# Altium footprint library SoM_Artix.PcbLib: 239 footprints (part 4 of 15)
Each footprint in its own frame and in the unit in brackets; x right, y up, seen from the top. Pads: shape width x height; smd on the part's side, far side on the other; paste and mask are expansions set on the pad; w line width, h text height; cw(c..) or ccw(c..) is an arc to the next point about the centre after c.
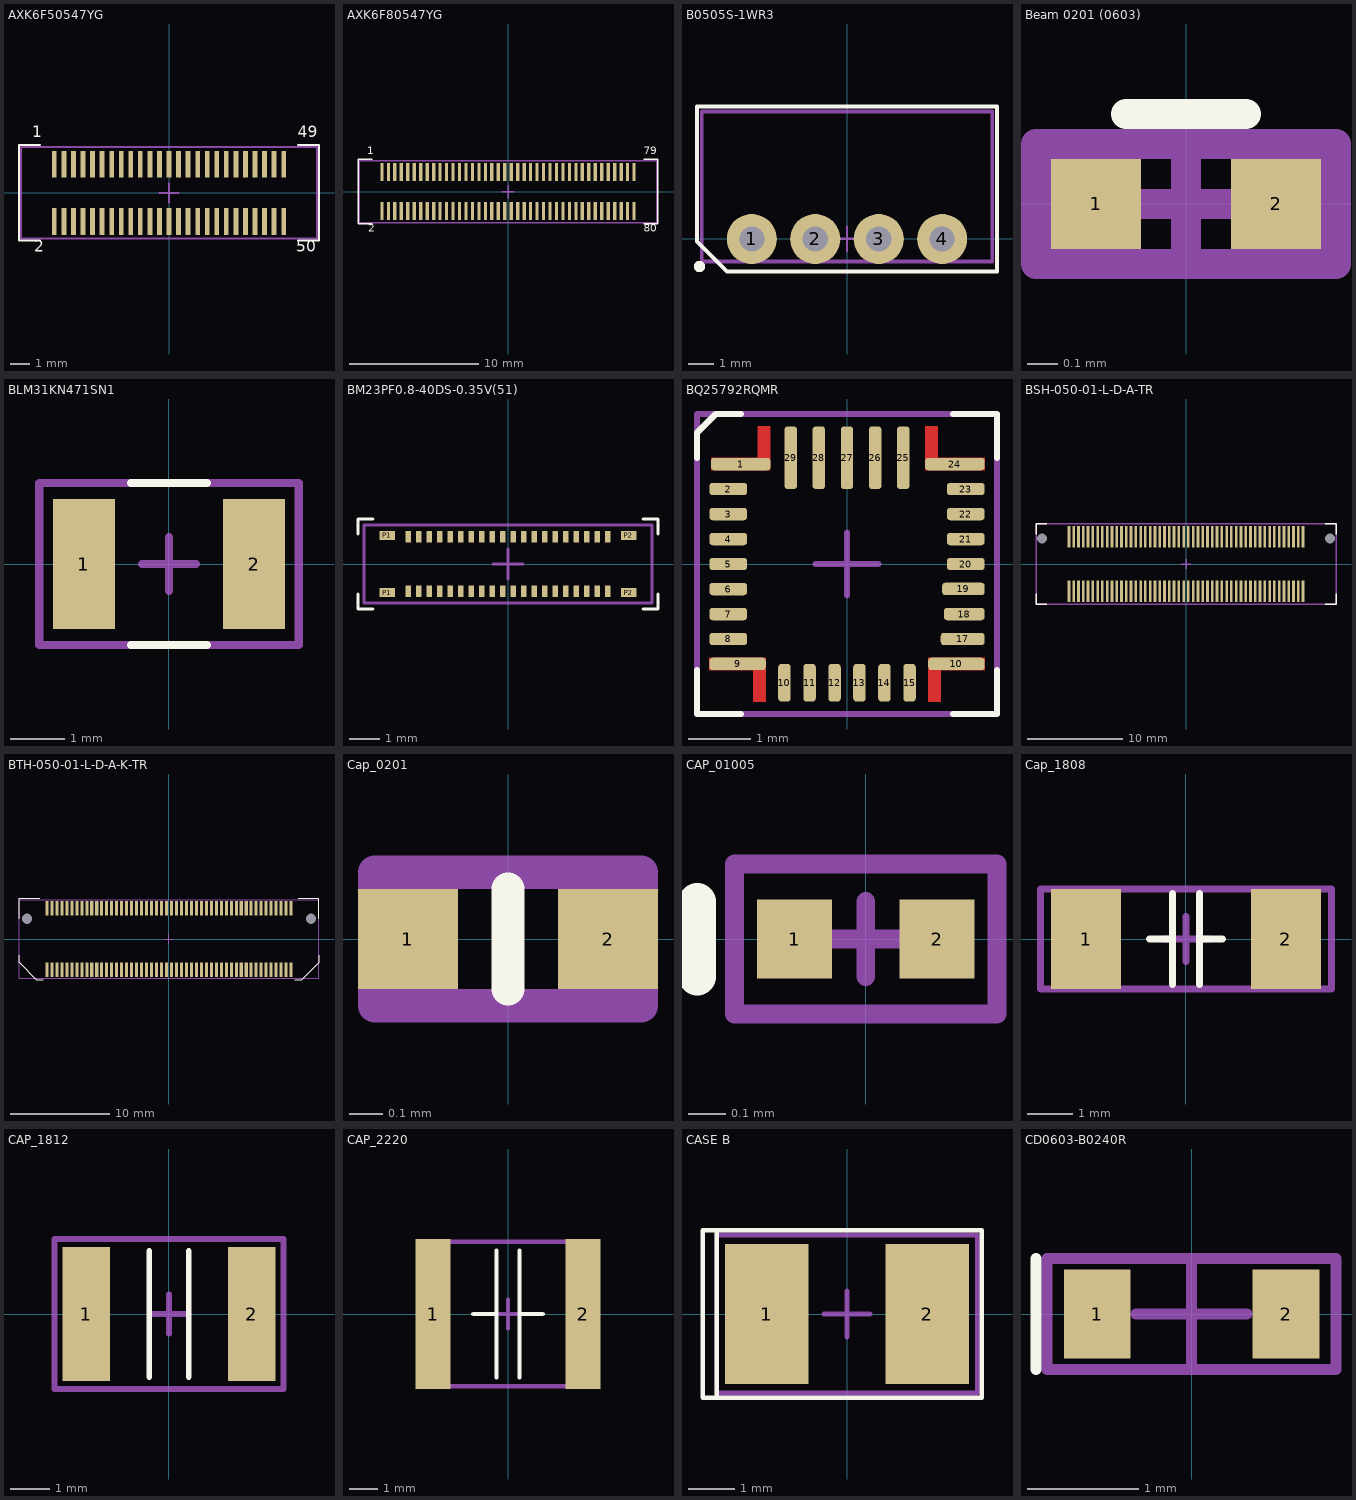
[diagram p3: the footprints below, top view; thin cyan lines are the x and y axes]

## AXK6F50547YG [mm] "Socket (Mated height: 2.5 mm)"
height 2.5
pads (50):
  rect 0.25x1.4 smd: 1(-6,1.5) 2(-6,-1.5) 3(-5.5,1.5) 4(-5.5,-1.5) 5(-5,1.5) 6(-5,-1.5) 7(-4.5,1.5) 8(-4.5,-1.5) 9(-4,1.5) 10(-4,-1.5) 11(-3.5,1.5) 12(-3.5,-1.5) 13(-3,1.5) 14(-3,-1.5) 15(-2.5,1.5) 16(-2.5,-1.5) 17(-2,1.5) 18(-2,-1.5) 19(-1.5,1.5) 20(-1.5,-1.5) 21(-1,1.5) 22(-1,-1.5) 23(-0.5,1.5) 24(-0.5,-1.5) 25(0,1.5) 26(0,-1.5) 27(0.5,1.5) 28(0.5,-1.5) 29(1,1.5) 30(1,-1.5) 31(1.5,1.5) 32(1.5,-1.5) 33(2,1.5) 34(2,-1.5) 35(2.5,1.5) 36(2.5,-1.5) 37(3,1.5) 38(3,-1.5) 39(3.5,1.5) 40(3.5,-1.5) 41(4,1.5) 42(4,-1.5) 43(4.5,1.5) 44(4.5,-1.5) 45(5,1.5) 46(5,-1.5) 47(5.5,1.5) 48(5.5,-1.5) 49(6,1.5) 50(6,-1.5)
Top Overlay:
  lines w0.1: -6.75,-2.5 -7.85,-2.5 -7.85,2.5 -6.75,2.5 ; 6.75,-2.5 7.85,-2.5 7.85,2.5 6.75,2.5
  text "50" at 6.65,-3.3 h1
  text "49" at 6.75,2.7 h1
  text "2" at -7.05,-3.3 h1
  text "1" at -7.15,2.7 h1
Mechanical 15:
  lines w0.1: -0.5,0 0.5,0 ; 0,-0.5 0,0.5 ; -7.75,-2.4 -7.75,2.4 7.75,2.4 7.75,-2.4 -7.75,-2.4
3D body "axk6f50547y.stp": height 1.75, standoff 0, extent -7.75,-1.65 7.75,1.65

## AXK6F80547YG [mm] "Socket (Mated height: 23 mm, 3.3 mm, 2.5 mm)"
height 2.5
pads (80):
  rect 0.25x1.4 smd: 1(-9.75,1.5) 2(-9.75,-1.5) 3(-9.25,1.5) 4(-9.25,-1.5) 5(-8.75,1.5) 6(-8.75,-1.5) 7(-8.25,1.5) 8(-8.25,-1.5) 9(-7.75,1.5) 10(-7.75,-1.5) 11(-7.25,1.5) 12(-7.25,-1.5) 13(-6.75,1.5) 14(-6.75,-1.5) 15(-6.25,1.5) 16(-6.25,-1.5) 17(-5.75,1.5) 18(-5.75,-1.5) 19(-5.25,1.5) 20(-5.25,-1.5) 21(-4.75,1.5) 22(-4.75,-1.5) 23(-4.25,1.5) 24(-4.25,-1.5) 25(-3.75,1.5) 26(-3.75,-1.5) 27(-3.25,1.5) 28(-3.25,-1.5) 29(-2.75,1.5) 30(-2.75,-1.5) 31(-2.25,1.5) 32(-2.25,-1.5) 33(-1.75,1.5) 34(-1.75,-1.5) 35(-1.25,1.5) 36(-1.25,-1.5) 37(-0.75,1.5) 38(-0.75,-1.5) 39(-0.25,1.5) 40(-0.25,-1.5) 41(0.25,1.5) 42(0.25,-1.5) 43(0.75,1.5) 44(0.75,-1.5) 45(1.25,1.5) 46(1.25,-1.5) 47(1.75,1.5) 48(1.75,-1.5) 49(2.25,1.5) 50(2.25,-1.5) 51(2.75,1.5) 52(2.75,-1.5) 53(3.25,1.5) 54(3.25,-1.5) 55(3.75,1.5) 56(3.75,-1.5) 57(4.25,1.5) 58(4.25,-1.5) 59(4.75,1.5) 60(4.75,-1.5) 61(5.25,1.5) 62(5.25,-1.5) 63(5.75,1.5) 64(5.75,-1.5) 65(6.25,1.5) 66(6.25,-1.5) 67(6.75,1.5) 68(6.75,-1.5) 69(7.25,1.5) 70(7.25,-1.5) 71(7.75,1.5) 72(7.75,-1.5) 73(8.25,1.5) 74(8.25,-1.5) 75(8.75,1.5) 76(8.75,-1.5) 77(9.25,1.5) 78(9.25,-1.5) 79(9.75,1.5) 80(9.75,-1.5)
Top Overlay:
  lines w0.1: -10.5,-2.5 -11.6,-2.5 -11.6,2.5 -10.5,2.5 ; 10.5,-2.5 11.6,-2.5 11.6,2.5 10.5,2.5
  text "2" at -10.8,-3.3 h1
  text "1" at -10.9,2.7 h1
  text "79" at 10.5,2.7 h1
  text "80" at 10.5,-3.3 h1
Mechanical 15:
  lines w0.1: -0.5,0 0.5,0 ; 0,-0.5 0,0.5 ; -11.5,-2.4 -11.5,2.4 11.5,2.4 11.5,-2.4 -11.5,-2.4
3D body "axk6f80547y.stp": height 1.75, standoff 0, extent -11.5,-1.65 11.5,1.65

## B0505S-1WR3 [mm]
pads (4):
  round 2 hole 1 mask+0.08: 1(-3.81,0) 2(-1.27,0) 3(1.27,0) 4(3.81,0)
Top Overlay:
  circle w0.254: c-5.9,-1.1 r0.1
  lines w0.15: -6,-0.1 -4.8,-1.3 6,-1.3 6,5.3 -6,5.3 -6,-0.1
Mechanical 15:
  lines w0.1: -0.5,0 0.5,0 ; 0,-0.5 0,0.5
  lines w0.15: -5.81,-0.9 5.81,-0.9 5.81,5.1 -5.81,5.1 -5.81,-0.9
3D body "B_S-1WR3.stp": height 10.2, standoff -4.06, extent -5.8,-0.85 5.8,5.15

## Beam 0201 (0603) [mm] "Ferrite Beam"
pads (2):
  rect 0.3x0.3 smd mask+0.05: 1(-0.3,0) 2(0.3,0)
Top Overlay:
  lines w0.1: -0.2,0.3 0.2,0.3
Mechanical 15:
  lines w0.1: -0.2,0 0.2,0 ; 0,-0.2 0,0.2 ; 0,0.2 -0.5,0.2 -0.5,-0.2 0.5,-0.2 0.5,0.2 0,0.2
3D body "742692003.stp": height 0.29, standoff -0.01, extent -0.3,-0.15 0.3,0.15

## BLM31KN471SN1 [mm]
pads (2):
  rect 1.15x2.4 smd: 1(-1.575,0) 2(1.575,0)
Top Overlay:
  lines w0.15: -0.7,-1.5 0.7,-1.5 ; -0.7,1.5 0.7,1.5
Mechanical 15:
  lines w0.15: -0.5,0 0.5,0 ; 0,-0.5 0,0.5 ; -2.4,-1.5 -2.4,1.5 2.4,1.5 2.4,-1.5 -2.4,-1.5
3D body "User Library-BLM31PG330SN1.step": height 1.11, standoff -0.01, extent -1.6,-0.81 1.6,0.81

## BM23PF0.8-40DS-0.35V(51) [mm]
height 0.8
pads (44):
  rect 0.18x0.38 smd mask+0.1: 1(-3.325,0.91) 2(-3.325,-0.91) 3(-2.975,0.91) 4(-2.975,-0.91) 5(-2.625,0.91) 6(-2.625,-0.91) 7(-2.275,0.91) 8(-2.275,-0.91) 9(-1.925,0.91) 10(-1.925,-0.91) 11(-1.575,0.91) 12(-1.575,-0.91) 13(-1.225,0.91) 14(-1.225,-0.91) 15(-0.875,0.91) 16(-0.875,-0.91) 17(-0.525,0.91) 18(-0.525,-0.91) 19(-0.175,0.91) 20(-0.175,-0.91) 21(0.175,0.91) 22(0.175,-0.91) 23(0.525,0.91) 24(0.525,-0.91) 25(0.875,0.91) 26(0.875,-0.91) 27(1.225,0.91) 28(1.225,-0.91) 29(1.575,0.91) 30(1.575,-0.91) 31(1.925,0.91) 32(1.925,-0.91) 33(2.275,0.91) 34(2.275,-0.91) 35(2.625,0.91) 36(2.625,-0.91) 37(2.975,0.91) 38(2.975,-0.91) 39(3.325,0.91) 40(3.325,-0.91)
  rect 0.52x0.3 smd: P1(-4.03,-0.95) P1(-4.03,0.95) P2(4.03,-0.95) P2(4.03,0.95)
Top Overlay:
  lines w0.1: -5,-1 -5,-1.5 -4.5,-1.5 ; -5,1 -5,1.5 -4.5,1.5 ; 4.5,-1.5 5,-1.5 5,-1 ; 4.5,1.5 5,1.5 5,1
Mechanical 13:
  lines w0.1: -0.5,0 0.5,0 ; 0,-0.5 0,0.5 ; -4.8,-1.3 -4.8,1.3 4.8,1.3 4.8,-1.3 -4.8,-1.3
3D body "BM23PF0.8-40DS-0.35V(51)_4800369051_3dstep.stp": height 0.79, standoff -0.01, extent -4.75,-0.995 4.75,0.985

## BQ25792RQMR [mm]
pads (29):
  rrect50% 0.95x0.2 smd mask+0.05: 1(-1.7,1.6) 24(1.725,1.6)
  rrect50% 0.6x0.2 smd mask+0.05: 2(-1.9,1.2) 3(-1.9,0.8) 4(-1.9,0.4) 5(-1.9,0) 6(-1.9,-0.4) 7(-1.9,-0.8) 8(-1.9,-1.2) 20(1.9,0) 21(1.9,0.4) 22(1.9,0.8) 23(1.9,1.2)
  rrect50% 0.9x0.2 smd mask+0.05: 9(-1.75,-1.6) 10(1.75,-1.6)
  rrect50% 0.2x0.6 smd mask+0.05: 10(-1,-1.9) 11(-0.6,-1.9) 12(-0.2,-1.9) 13(0.2,-1.9) 14(0.6,-1.9) 15(1,-1.9)
  rrect50% 0.7x0.2 smd mask+0.05: 17(1.85,-1.2)
  rrect50% 0.65x0.2 smd mask+0.05: 18(1.875,-0.8)
  rrect50% 0.68x0.2 smd mask+0.05: 19(1.863,-0.4)
  rrect50% 0.2x1 smd mask+0.05: 25(0.9,1.7) 26(0.45,1.7) 27(0,1.7) 28(-0.45,1.7) 29(-0.9,1.7)
Top Layer:
  region: -2.175,1.5 -2.175,1.7 -1.425,1.7 -1.425,2.2 -1.225,2.2 -1.225,1.5
  region: 2.2,1.5 2.2,1.7 1.45,1.7 1.45,2.2 1.25,2.2 1.25,1.5
  region: -2.2,-1.5 -2.2,-1.7 -1.5,-1.7 -1.5,-2.2 -1.3,-2.2 -1.3,-1.5
  region: 2.2,-1.5 2.2,-1.7 1.5,-1.7 1.5,-2.2 1.3,-2.2 1.3,-1.5
Top Overlay:
  lines w0.1: -2.4,-1.7 -2.4,-2.4 -1.7,-2.4 ; -2.4,1.7 -2.4,2.1 -2.1,2.4 -1.7,2.4 ; 1.7,-2.4 2.4,-2.4 2.4,-1.7 ; 1.7,2.4 2.4,2.4 2.4,1.7
Mechanical 15:
  lines w0.1: -0.5,0 0.5,0 ; 0,-0.5 0,0.5 ; -2.4,-2.4 -2.4,2.4 2.4,2.4 2.4,-2.4 -2.4,-2.4
3D body "RQM0029A.stp": height 1, standoff 0, extent -2,-2 2,2

## BSH-050-01-L-D-A-TR [mm]
pads (102):
  rect 0.279x2.273 smd mask+0.05: 1(-12.25,-2.864) 2(-12.25,2.864) 3(-11.75,-2.864) 4(-11.75,2.864) 5(-11.25,-2.864) 6(-11.25,2.864) 7(-10.75,-2.864) 8(-10.75,2.864) 9(-10.25,-2.864) 10(-10.25,2.864) 11(-9.75,-2.864) 12(-9.75,2.864) 13(-9.25,-2.864) 14(-9.25,2.864) 15(-8.75,-2.864) 16(-8.75,2.864) 17(-8.25,-2.864) 18(-8.25,2.864) 19(-7.75,-2.864) 20(-7.75,2.864) 21(-7.25,-2.864) 22(-7.25,2.864) 23(-6.75,-2.864) 24(-6.75,2.864) 25(-6.25,-2.864) 26(-6.25,2.864) 27(-5.75,-2.864) 28(-5.75,2.864) 29(-5.25,-2.864) 30(-5.25,2.864) 31(-4.75,-2.864) 32(-4.75,2.864) 33(-4.25,-2.864) 34(-4.25,2.864) 35(-3.75,-2.864) 36(-3.75,2.864) 37(-3.25,-2.864) 38(-3.25,2.864) 39(-2.75,-2.864) 40(-2.75,2.864) 41(-2.25,-2.864) 42(-2.25,2.864) 43(-1.75,-2.864) 44(-1.75,2.864) 45(-1.25,-2.864) 46(-1.25,2.864) 47(-0.75,-2.864) 48(-0.75,2.864) 49(-0.25,-2.864) 50(-0.25,2.864) 51(0.25,-2.864) 52(0.25,2.864) 53(0.75,-2.864) 54(0.75,2.864) 55(1.25,-2.864) 56(1.25,2.864) 57(1.75,-2.864) 58(1.75,2.864) 59(2.25,-2.864) 60(2.25,2.864) 61(2.75,-2.864) 62(2.75,2.864) 63(3.25,-2.864) 64(3.25,2.864) 65(3.75,-2.864) 66(3.75,2.864) 67(4.25,-2.864) 68(4.25,2.864) 69(4.75,-2.864) 70(4.75,2.864) 71(5.25,-2.864) 72(5.25,2.864) 73(5.75,-2.864) 74(5.75,2.864) 75(6.25,-2.864) 76(6.25,2.864) 77(6.75,-2.864) 78(6.75,2.864) 79(7.25,-2.864) 80(7.25,2.864) 81(7.75,-2.864) 82(7.75,2.864) 83(8.25,-2.864) 84(8.25,2.864) 85(8.75,-2.864) 86(8.75,2.864) 87(9.25,-2.864) 88(9.25,2.864) 89(9.75,-2.864) 90(9.75,2.864) 91(10.25,-2.864) 92(10.25,2.864) 93(10.75,-2.864) 94(10.75,2.864) 95(11.25,-2.864) 96(11.25,2.864) 97(11.75,-2.864) 98(11.75,2.864) 99(12.25,-2.864) 100(12.25,2.864)
  round 0 hole 1.016 unplated mask+0.05: 125(-15.07,2.666) 126(15.07,2.666)
Top Overlay:
  lines w0.15: -15.7,-3.1 -15.7,-4.2 -14.6,-4.2 ; -15.7,3.1 -15.7,4.2 -14.6,4.2 ; 14.6,-4.2 15.7,-4.2 15.7,-3.1 ; 14.6,4.2 15.7,4.2 15.7,3.1
Mechanical 15:
  lines w0.15: -0.5,0 0.5,0 ; 0,-0.5 0,0.5 ; -15.7,-4.2 15.7,-4.2 15.7,4.2 -15.7,4.2 -15.7,-4.2
3D body "BSH-050-01-L-D-A-TR.stp": height 3.25, standoff -0.75, extent -15.638,-3.746 15.638,3.746

## BTH-050-01-L-D-A-K-TR [mm]
pads (102):
  rect 0.305x1.448 smd mask+0.05: 1(-12.25,3.086) 2(-12.25,-3.086) 3(-11.75,3.086) 4(-11.75,-3.086) 5(-11.25,3.086) 6(-11.25,-3.086) 7(-10.75,3.086) 8(-10.75,-3.086) 9(-10.25,3.086) 10(-10.25,-3.086) 11(-9.75,3.086) 12(-9.75,-3.086) 13(-9.25,3.086) 14(-9.25,-3.086) 15(-8.75,3.086) 16(-8.75,-3.086) 17(-8.25,3.086) 18(-8.25,-3.086) 19(-7.75,3.086) 20(-7.75,-3.086) 21(-7.25,3.086) 22(-7.25,-3.086) 23(-6.75,3.086) 24(-6.75,-3.086) 25(-6.25,3.086) 26(-6.25,-3.086) 27(-5.75,3.086) 28(-5.75,-3.086) 29(-5.25,3.086) 30(-5.25,-3.086) 31(-4.75,3.086) 32(-4.75,-3.086) 33(-4.25,3.086) 34(-4.25,-3.086) 35(-3.75,3.086) 36(-3.75,-3.086) 37(-3.25,3.086) 38(-3.25,-3.086) 39(-2.75,3.086) 40(-2.75,-3.086) 41(-2.25,3.086) 42(-2.25,-3.086) 43(-1.75,3.086) 44(-1.75,-3.086) 45(-1.25,3.086) 46(-1.25,-3.086) 47(-0.75,3.086) 48(-0.75,-3.086) 49(-0.25,3.086) 50(-0.25,-3.086) 51(0.25,3.086) 52(0.25,-3.086) 53(0.75,3.086) 54(0.75,-3.086) 55(1.25,3.086) 56(1.25,-3.086) 57(1.75,3.086) 58(1.75,-3.086) 59(2.25,3.086) 60(2.25,-3.086) 61(2.75,3.086) 62(2.75,-3.086) 63(3.25,3.086) 64(3.25,-3.086) 65(3.75,3.086) 66(3.75,-3.086) 67(4.25,3.086) 68(4.25,-3.086) 69(4.75,3.086) 70(4.75,-3.086) 71(5.25,3.086) 72(5.25,-3.086) 73(5.75,3.086) 74(5.75,-3.086) 75(6.25,3.086) 76(6.25,-3.086) 77(6.75,3.086) 78(6.75,-3.086) 79(7.25,3.086) 80(7.25,-3.086) 81(7.75,3.086) 82(7.75,-3.086) 83(8.25,3.086) 84(8.25,-3.086) 85(8.75,3.086) 86(8.75,-3.086) 87(9.25,3.086) 88(9.25,-3.086) 89(9.75,3.086) 90(9.75,-3.086) 91(10.25,3.086) 92(10.25,-3.086) 93(10.75,3.086) 94(10.75,-3.086) 95(11.25,3.086) 96(11.25,-3.086) 97(11.75,3.086) 98(11.75,-3.086) 99(12.25,3.086) 100(12.25,-3.086)
  round 0 hole 1.016 unplated mask+0.05: TH(-14.236,2.032) TH(14.236,2.032)
Top Overlay:
  lines w0.1: -15.05,-1.65 -15.05,-2.35 -13.3,-4.1 -12.6,-4.1 ; -15.05,2.032 -15.05,4.1 -12.982,4.1 ; 12.6,-4.1 13.3,-4.1 15.05,-2.35 15.05,-1.65 ; 12.982,4.1 15.05,4.1 15.05,2.032
Mechanical 15:
  lines w0.1: -0.5,0 0.5,0 ; 0,-0.5 0,0.5 ; -15.05,-3.943 -15.05,3.943 15.05,3.943 15.05,-3.943 -15.05,-3.943
3D body "BTH-050-01-L-D-A-K-TR.stp": height 4.39, standoff -0.75, extent -15.003,-3.556 15.003,3.556

## Cap_0201 [mm]
pads (2):
  rect 0.3x0.3 smd mask+0.05: 1(-0.3,0) 2(0.3,0)
Top Overlay:
  lines w0.1: 0,-0.15 0,0.15
Mechanical 15:
  lines w0.1: -0.4,-0.2 0.4,-0.2 0.4,0.2 -0.4,0.2 -0.4,-0.2
3D body "User Library-User Library-0201_Cap.step": height 0.31, standoff 0, extent -0.44,-0.15 0.44,0.15

## CAP_01005 [mm]
pads (2):
  rect 0.2x0.21 smd mask+0.04: 1(-0.19,0) 2(0.19,0)
Top Overlay:
  lines w0.1: -0.45,-0.1 -0.45,0.1
Mechanical 15:
  lines w0.05: -0.1,0 0.1,0 ; 0,-0.1 0,0.1 ; -0.35,-0.2 -0.35,0.2 0.35,0.2 0.35,-0.2 -0.35,-0.2
3D body "User Library-01005_capacitor-NPO.step": height 0.22, standoff 0, extent -0.2,-0.1 0.2,0.1

## Cap_1808 [mm]
height 2.2
pads (2):
  rect 1.55x2.2 smd: 1(-2.2,0) 2(2.2,0)
Top Overlay:
  lines w0.15: -0.8,0 -0.3,0 ; -0.3,-1 -0.3,1 ; 0.3,-1 0.3,1 ; 0.3,0 0.8,0
Mechanical 13:
  lines w0.15: -0.5,0 0.5,0 ; 0,-0.5 0,0.5 ; -3.2,-1.1 3.2,-1.1 3.2,1.1 -3.2,1.1 -3.2,-1.1
3D body "User Library-Chip Cap_MLCC_1808 (4520)_K.step": height 2, standoff 0, extent -2.25,-1 2.25,1.03

## CAP_1812 [mm]
pads (2):
  rect 1.2x3.4 smd: 1(-2.1,0) 2(2.1,0)
Top Overlay:
  lines w0.15: -0.5,-1.6 -0.5,1.6 ; 0.5,-1.6 0.5,1.6
Mechanical 13:
  lines w0.15: -0.5,0 0.5,0 ; 0,-0.5 0,0.5 ; -2.9,-1.9 2.9,-1.9 2.9,1.9 -2.9,1.9 -2.9,-1.9
3D body "User Library-1812 SMD Capacitor.step": height 1.6, standoff 0, extent -2.25,-1.6 2.25,1.6

## CAP_2220 [mm]
height 2.5
pads (2):
  rect 1.2x5.2 smd: 1(-2.6,0) 2(2.6,0)
Top Overlay:
  lines w0.15: -1.2,0 -0.4,0 ; -0.4,-2.2 -0.4,2.2 ; 0.4,-2.2 0.4,2.2 ; 0.4,0 1.2,0
Mechanical 13:
  lines w0.15: -0.5,0 0.5,0 ; 0,-0.5 0,0.5 ; -2.85,-2.5 2.85,-2.5 2.85,2.5 -2.85,2.5 -2.85,-2.5
3D body "User Library-CAPC5750.step": height 2.5, standoff 0, extent -2.85,-2.5 2.85,2.5

## CASE B [mm]
pads (2):
  rect 1.8x3 smd: 1(-1.725,0) 2(1.725,0)
Top Overlay:
  lines w0.1: -2.8,-1.8 2.9,-1.8 2.9,1.8 -2.8,1.8 ; -2.8,-1.8 -2.8,1.8 ; -2.8,-1.8 -3.1,-1.8 -3.1,1.8 -2.8,1.8
Mechanical 13:
  lines w0.1: -0.5,0 0.5,0 ; 0,-0.5 0,0.5 ; -2.8,-1.7 -2.8,1.7 2.8,1.7 2.8,-1.7 -2.8,-1.7
3D body "User Library-CaseB_3528-21.step": height 1.9, standoff 0, extent -1.75,-1.4 1.75,1.4

## CD0603-B0240R [mm]
pads (2):
  rect 0.6x0.8 smd: 1(-0.85,0) 2(0.85,0)
Top Overlay:
  lines w0.1: -1.4,-0.5 -1.4,0.5
Mechanical 15:
  lines w0.1: -0.5,0 0.5,0 ; 0,-0.5 0,0.5 ; -1.3,-0.5 -1.3,0.5 1.3,0.5 1.3,-0.5 -1.3,-0.5
3D body "mf-fsmf020x-2.stp": height 0.48, standoff 0, extent -0.825,-0.425 0.825,0.425